# Altium footprint library Relay.PcbLib: 60 footprints (part 4 of 4)
Each footprint in its own frame and in the unit in brackets; x right, y up, seen from the top. Pads: shape width x height; smd on the part's side, far side on the other; paste and mask are expansions set on the pad; w line width, h text height; cw(c..) or ccw(c..) is an arc to the next point about the centre after c.
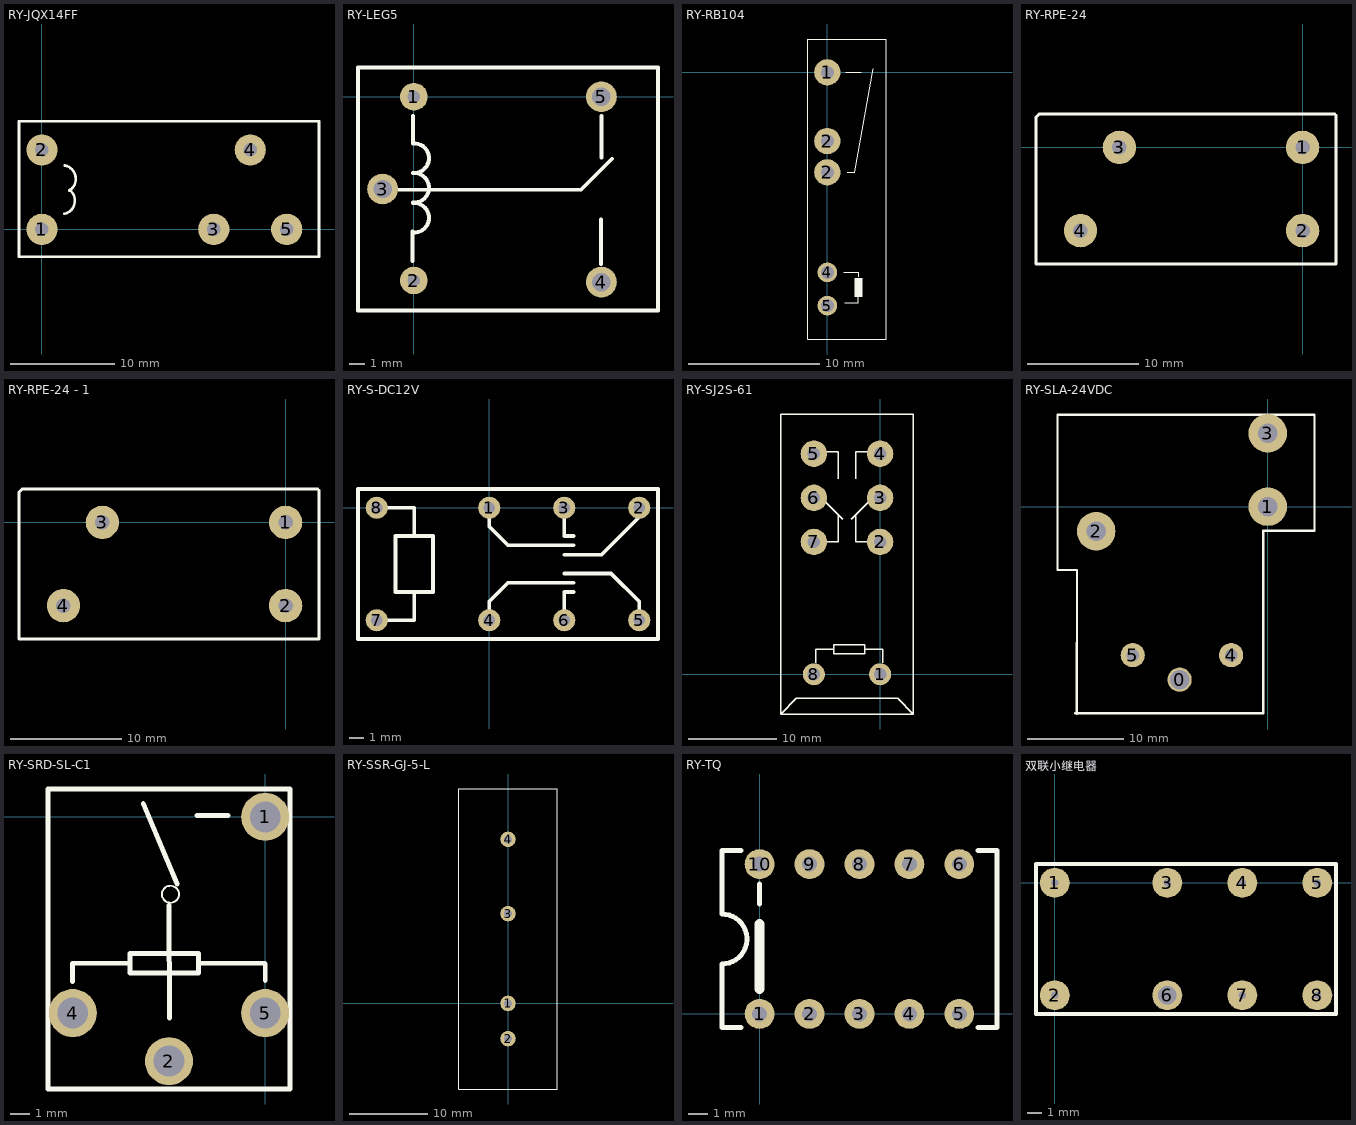
[diagram p3: the footprints below, top view; thin cyan lines are the x and y axes]

## RY-JQX14FF [mm]
pads (5):
  round 3 hole 1.3: 1(0,0) 2(0,7.62) 3(16.5,0) 4(20,7.62) 5(23.5,0)
Top Overlay:
  lines w0.254: 2.172,1.478 ccw(c1.85,2.755) 2.655,3.797 ; 2.194,6.129 cw(c1.933,4.838) 2.635,3.724 ; -2.2,-2.63 26.6,-2.63 26.6,10.37 -2.2,10.37 -2.2,-2.63

## RY-LEG5 [mm]
pads (5):
  round 1.8 hole 0.8: 1(0,0) 2(0,-11.965)
  round 2 hole 1.2: 3(-2.032,-6.007) 4(12.217,-12.065) 5(12.217,0)
Top Overlay:
  lines w0.254: -0.965,-6.058 10.897,-6.058 12.916,-4.039 ; -0.076,-10.706 -0.076,-8.776 ; -0.051,-8.852 ccw(c0.021,-7.887) -0.04,-6.922 ; -0.051,-6.896 ccw(c0.021,-5.932) -0.04,-4.966 ; -0.051,-4.966 ccw(c0.021,-4.001) -0.04,-3.036 -0.04,-1.243 ; 12.192,-10.884 12.192,-7.988 ; 12.217,-3.95 12.217,-1.257 ; -3.632,-13.919 15.9,-13.919 15.9,1.905 -3.632,1.905 -3.632,-13.919
3D body "User Library-SONGLE Relay SRU-12VDC-SL-C.step": height 15.3, standoff -5, extent -3.403,-13.906 15.697,1.594

## RY-RB104 [mm]
pads (5):
  round 2 hole 1: 1(0,0) 2(0,-7.62) 2(0,-5.24)
  round 1.5 hole 1: 4(0,-15.24) 5(0,-17.78)
Top Overlay:
  region: 2.081,-15.667 2.081,-17.101 2.666,-17.101 2.666,-15.667
  lines w0.051: 1.253,-15.241 2.382,-15.241 2.382,-15.577 ; 1.332,-17.561 2.347,-17.561 2.347,-17.118 ; 1.4,-0.004 2.575,-0.004 ; 1.526,-7.621 2.089,-7.621 3.493,0.282 ; -1.5,-20.32 -1.5,2.54 4.5,2.54 4.5,-20.32 -1.5,-20.32

## RY-RPE-24 [mm]
pads (4):
  round 3 hole 1.3: 1(0,0) 2(0,-7.5) 3(-16.5,0) 4(-20,-7.5)
Top Overlay:
  lines w0.254: -24,-10.5 -24,-1.016 -24,2.536 -24,2.708 -23.708,3 -21.844,3 0,3 2.88,3 3,2.88 3,2.612 3,1.524 3,-10.5 -0.508,-10.5 -22.352,-10.5 -24,-10.5

## RY-RPE-24 - 1 [mm]
pads (4):
  round 3 hole 1.3: 1(0,0) 2(0,-7.5) 3(-16.5,0) 4(-20,-7.5)
Top Overlay:
  lines w0.254: -24,-10.5 -22.352,-10.5 -0.508,-10.5 3,-10.5 3,1.524 3,2.612 3,2.88 2.88,3 0,3 -21.844,3 -23.708,3 -24,2.708 -24,2.536 -24,-1.016 -24,-10.5

## RY-S-DC12V [mm]
pads (8):
  round 1.5 hole 0.8: 1(0,0) 2(10.16,0) 3(5.08,0) 4(0,-7.62) 5(10.16,-7.62) 6(5.08,-7.62) 7(-7.62,-7.62) 8(-7.62,0)
Top Overlay:
  lines w0.254: -7.62,-7.62 -5.08,-7.62 -5.08,-5.715 ; -7.62,0 -5.08,0 -5.08,-1.905 ; 0,-7.62 0,-6.35 1.27,-5.08 2.54,-5.08 5.715,-5.08 ; 0,0 0,-1.27 1.27,-2.54 5.715,-2.54 ; 5.08,-7.62 5.08,-5.715 5.715,-5.715 ; 5.08,-4.445 8.255,-4.445 10.16,-6.35 ; 5.08,-3.175 7.62,-3.175 10.16,-0.635 10.16,0 ; 5.08,0 5.08,-1.905 5.715,-1.905 ; 10.16,-6.35 10.16,-7.62 10.16,-6.35 ; -8.89,-8.89 11.43,-8.89 11.43,1.27 -8.89,1.27 -8.89,-8.89 ; -6.35,-5.715 -3.81,-5.715 -3.81,-1.905 -6.35,-1.905 -6.35,-5.715

## RY-SJ2S-61 [mm]
pads (8):
  round 2.5 hole 1.4: 1(0,0) 8(-7.5,0)
  round 3 hole 1.4: 2(0,15) 3(0,20) 4(0,25) 5(-7.5,25) 6(-7.5,20) 7(-7.5,15)
Top Overlay:
  lines w0.152: -7.306,1.324 -7.306,2.848 -5.274,2.848 ; -6.29,15.04 -4.766,15.04 -4.766,18.088 ; -6.29,19.612 -4.258,17.58 ; -6.29,25.2 -4.766,25.2 -4.766,22.152 ; -3.242,17.58 -1.21,19.612 ; -2.734,18.088 -2.734,15.04 -1.21,15.04 ; -2.734,22.152 -2.734,22.66 -2.734,25.2 -1.21,25.2 ; -1.718,2.848 0.314,2.848 0.314,1.324 ; -11.25,-4.5 -9.49,-2.74 1.99,-2.74 3.75,-4.5 ; -11.25,-4.5 -11.25,29.5 3.75,29.5 3.75,-4.5 ; -11.25,-4.5 3.75,-4.5 ; -5.274,2.34 -5.274,3.356 -1.718,3.356 -1.718,2.34 -5.274,2.34

## RY-SLA-24VDC [mm]
pads (6):
  round 2.5 hole 2: 0(-9.144,-17.94)
  round 4 hole 2: 1(0,0) 2(-17.8,-2.54) 3(0,7.6)
  round 2.5 hole 1.3: 4(-3.8,-15.4) 5(-14,-15.4)
Top Overlay:
  lines w0.254: -21.8,-6.572 -19.8,-6.572 ; -21.8,-6.544 -21.8,9.504 4.8,9.504 ; -19.96,-21.4 -17.8,-21.4 -0.484,-21.4 ; -19.8,-21.496 -19.78,-6.572 ; -0.484,-21.328 -0.484,-2.508 0.072,-2.508 4.836,-2.508 4.836,9.492

## RY-SRD-SL-C1 [mm]
pads (4):
  round 2.5 hole 1.6: 1(0,0) 2(-5,-12.7) 4(-10,-10.2) 5(0,-10.2)
Top Overlay:
  circle w0.1: c-4.925,-4.023 r0.443
  lines w0.254: -10.022,-7.649 -10.019,-8.551 ; -10.008,-7.62 -7.135,-7.614 ; -6.341,0.693 -4.568,-3.504 ; -5.001,-4.6 -4.972,-10.457 ; -3.559,0.073 -1.938,0.073 ; -3.463,-7.614 -0.026,-7.614 0.003,-7.643 0.003,-8.508 ; -11.3,-14.15 -11.3,1.45 1.3,1.45 1.3,-14.15 -11.3,-14.15 ; -7.019,-8.111 -3.463,-8.111 -3.463,-7.095 -7.019,-7.095 -7.019,-8.111

## RY-SSR-GJ-5-L [mm]
pads (4):
  round 2 hole 1: 1(0,0) 2(0,-4.5) 3(0,11.5) 4(0,21)
Top Overlay:
  lines w0.152: -6.3,-10.95 -6.3,27.45 6.3,27.45 6.3,-10.95 -6.3,-10.95

## RY-TQ [mil]
pads (10):
  round 60 hole 30: 1(0,0) 2(100,0) 3(200,0) 4(300,0) 5(400,0) 6(400,300) 7(300,300) 8(200,300) 9(100,300) 10(0,300)
Top Overlay:
  lines w10: -37.8,-27.16 -75.59,-27.16 -75.59,100 ccw(c-75.59,150) -75.59,200 -75.59,327.17 -37.8,327.17 ; 0,220 0,260 ; 437.8,-27.16 475.59,-27.16 475.59,327.17 437.8,327.17
  lines w20: 0,50 0,180

## 双联小继电器 [mil]
pads (8):
  round 80 hole 20: 1(0,0) 2(0,-300) 3(300,0) 4(500,0) 5(700,0) 7(500,-300) 8(700,-300)
  round 80 hole 50: 6(300,-300)
Top Overlay:
  lines w10: -50,-350 750,-350 750,50 -50,50 -50,-350
3D body "双联继电器.step": height 449.32, standoff -90.55, extent -46.64,-346 748.64,47.7